# Altium footprint library 20210518.PcbLib: 414 footprints (part 24 of 26)
Each footprint in its own frame and in the unit in brackets; x right, y up, seen from the top. Pads: shape width x height; smd on the part's side, far side on the other; paste and mask are expansions set on the pad; w line width, h text height; cw(c..) or ccw(c..) is an arc to the next point about the centre after c.
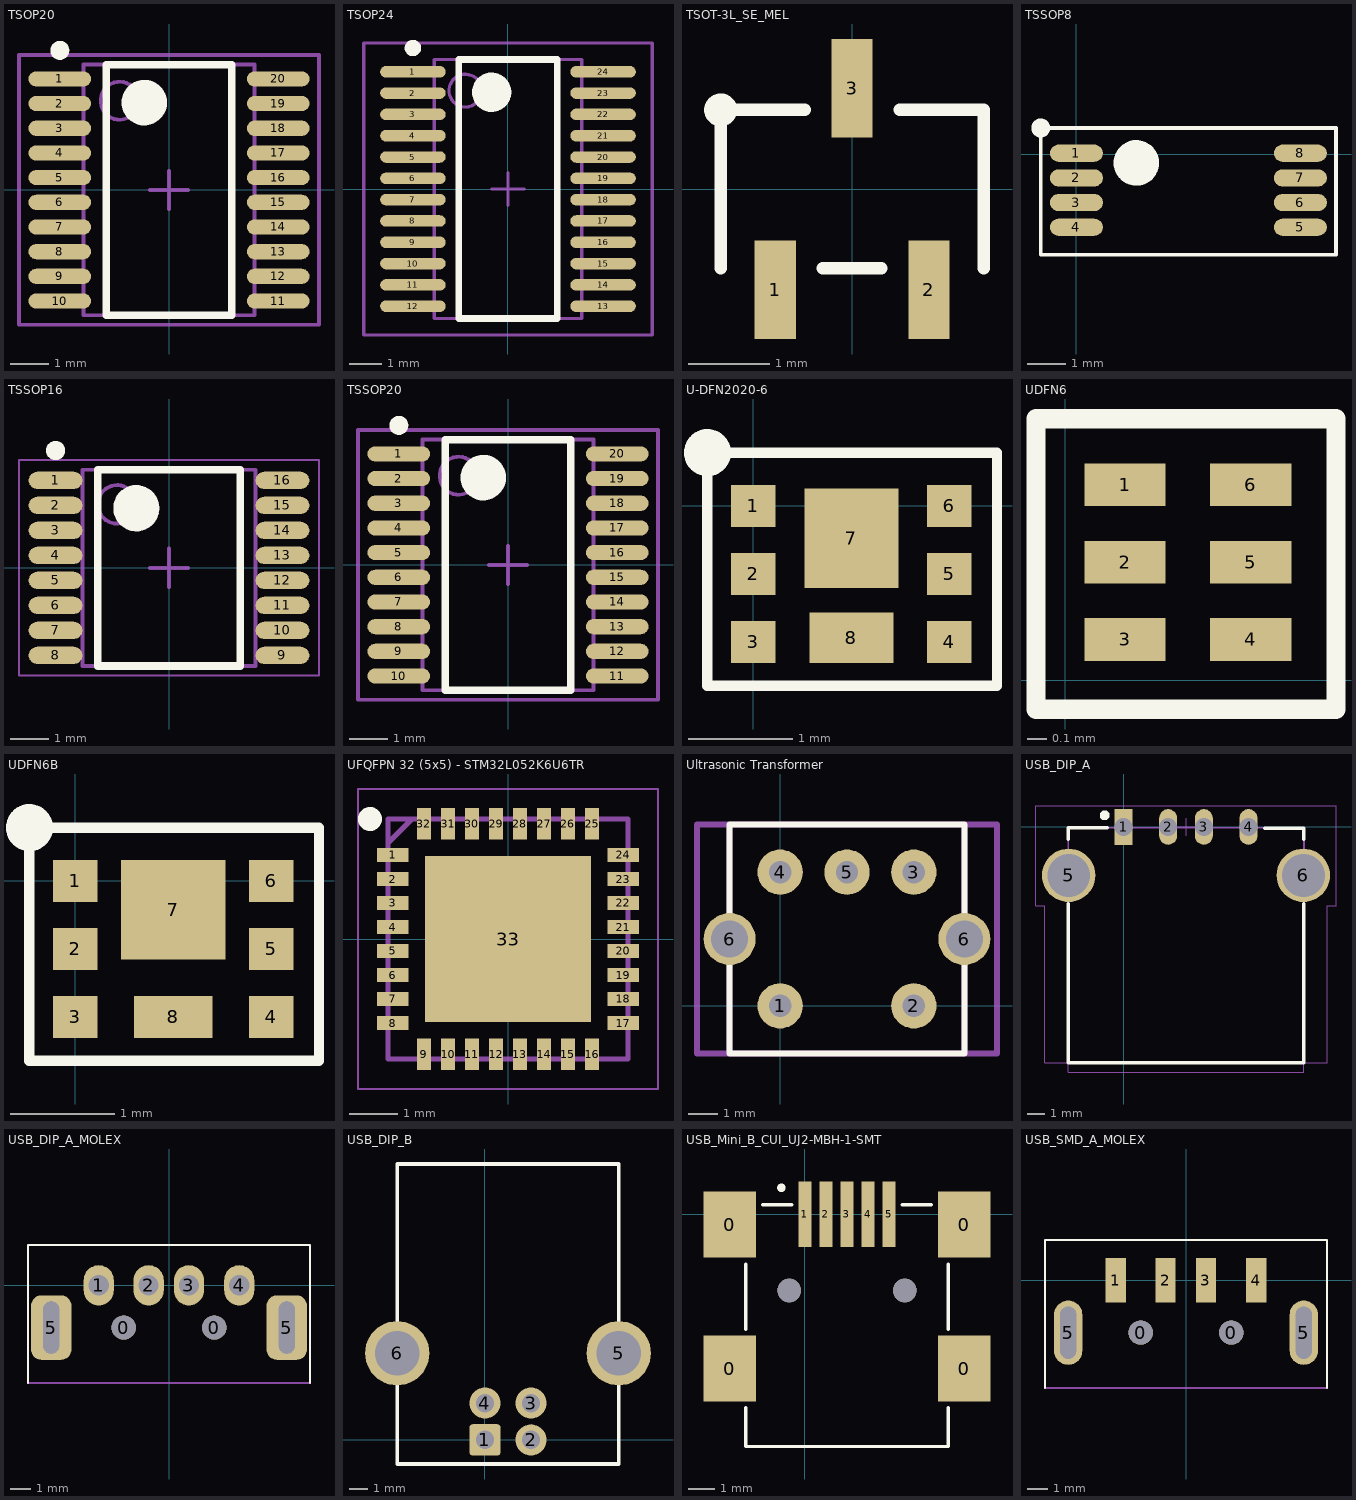
[diagram p23: the footprints below, top view; thin cyan lines are the x and y axes]

## TSOP20 [mm] "TSOP, 20-Leads, Body 6,6x4,5mm (max), Pitch 0,65mm, IPC Medium Density"
height 1.45
pads (20):
  oval 1.65x0.4 smd: 1(-2.875,2.925) 2(-2.875,2.275) 3(-2.875,1.625) 4(-2.875,0.975) 5(-2.875,0.325) 6(-2.875,-0.325) 7(-2.875,-0.975) 8(-2.875,-1.625) 9(-2.875,-2.275) 10(-2.875,-2.925) 11(2.875,-2.925) 12(2.875,-2.275) 13(2.875,-1.625) 14(2.875,-0.975) 15(2.875,-0.325) 16(2.875,0.325) 17(2.875,0.975) 18(2.875,1.625) 19(2.875,2.275) 20(2.875,2.925)
Top Overlay:
  circle w0.6: c-0.65,2.3 r0.3
  circle w0.25: c-2.875,3.675 r0.125
  lines w0.2: -1.65,-3.3 1.65,-3.3 1.65,3.3 -1.65,3.3 -1.65,-3.3
Mechanical 13:
  circle w0.1: c-1.3,2.35 r0.5
  lines w0.1: -2.25,-3.3 2.25,-3.3 2.25,3.3 -2.25,3.3 -2.25,-3.3
Mechanical 15:
  lines w0.1: -0.5,0 0.5,0 ; 0,-0.5 0,0.5 ; -3.95,-3.55 3.95,-3.55 3.95,3.55 -3.95,3.55 -3.95,-3.55
3D body: height 1.79, standoff -0.05, extent -3.3,-3.3 3.3,3.3

## TSOP24 [mm] "TSOP, 24-Leads, Body 7,9x4,5mm (max), Pitch 0,65mm, IPC Low Density"
height 1.2
pads (24):
  oval 2x0.35 smd: 1(-2.9,3.575) 2(-2.9,2.925) 3(-2.9,2.275) 4(-2.9,1.625) 5(-2.9,0.975) 6(-2.9,0.325) 7(-2.9,-0.325) 8(-2.9,-0.975) 9(-2.9,-1.625) 10(-2.9,-2.275) 11(-2.9,-2.925) 12(-2.9,-3.575) 13(2.9,-3.575) 14(2.9,-2.925) 15(2.9,-2.275) 16(2.9,-1.625) 17(2.9,-0.975) 18(2.9,-0.325) 19(2.9,0.325) 20(2.9,0.975) 21(2.9,1.625) 22(2.9,2.275) 23(2.9,2.925) 24(2.9,3.575)
Top Overlay:
  circle w0.6: c-0.5,2.95 r0.3
  circle w0.25: c-2.9,4.3 r0.125
  lines w0.2: -1.5,-3.95 1.5,-3.95 1.5,3.95 -1.5,3.95 -1.5,-3.95
Mechanical 13:
  circle w0.1: c-1.3,3 r0.5
  lines w0.1: -2.25,-3.95 2.25,-3.95 2.25,3.95 -2.25,3.95 -2.25,-3.95
Mechanical 15:
  lines w0.1: -0.5,0 0.5,0 ; 0,-0.5 0,0.5 ; -4.4,-4.45 4.4,-4.45 4.4,4.45 -4.4,4.45 -4.4,-4.45
3D body: height 1.2, standoff 0, extent -3.251,-3.963 3.299,3.937

## TSOT-3L_SE_MEL [mil]
pads (3):
  rect 20x48 smd: 1(-37.4,-49) 2(37.4,-49) 3(0,49)
Top Overlay:
  circle w6: c-64,38.5 r5
  lines w6: -64,-38.5 -64,38.5 -23.1,38.5 ; -14.3,-38.5 14.3,-38.5 ; 23.1,38.5 64,38.5 64,-38.5
3D body: height 39.09, standoff 0, extent -59.02,-58.01 59.01,60.02

## TSSOP8 [mm]
pads (8):
  oval 1.4x0.45 smd: 1(0,0.025) 2(0,-0.625) 3(0,-1.275) 4(0,-1.925) 5(5.9,-1.925) 6(5.9,-1.275) 7(5.9,-0.625) 8(5.9,0.025)
Top Overlay:
  circle w0.25: c-0.94,0.69 r0.125
  circle w0.6: c1.58,-0.23 r0.3
  lines w0.1: -0.94,-2.65 6.84,-2.65 6.84,0.69 -0.94,0.69 -0.94,-2.65
3D body: height 1.08, standoff -0.02, extent -0.202,-2.464 6.198,0.536

## TSSOP16 [mm] "TSSOP, 16-Leads, Body 5,00x4,40mm, Pitch 0,65mm, IPC Medium Density"
height 1.2
pads (16):
  oval 1.4x0.45 smd: 1(-2.95,2.275) 2(-2.95,1.625) 3(-2.95,0.975) 4(-2.95,0.325) 5(-2.95,-0.325) 6(-2.95,-0.975) 7(-2.95,-1.625) 8(-2.95,-2.275) 9(2.95,-2.275) 10(2.95,-1.625) 11(2.95,-0.975) 12(2.95,-0.325) 13(2.95,0.325) 14(2.95,0.975) 15(2.95,1.625) 16(2.95,2.275)
Top Overlay:
  circle w0.6: c-0.85,1.55 r0.3
  circle w0.25: c-2.95,3.05 r0.125
  lines w0.2: -1.85,-2.55 1.85,-2.55 1.85,2.55 -1.85,2.55 -1.85,-2.55
Mechanical 13:
  circle w0.1: c-1.35,1.65 r0.5
  lines w0.1: -2.25,-2.55 2.25,-2.55 2.25,2.55 -2.25,2.55 -2.25,-2.55
Mechanical 15:
  lines w0.05: -3.9,-2.8 3.9,-2.8 3.9,2.8 -3.9,2.8 -3.9,-2.8
  lines w0.1: -0.5,0 0.5,0 ; 0,-0.5 0,0.5
3D body: height 1.09, standoff 0, extent -3.166,-2.514 3.114,2.486

## TSSOP20 [mm]
height 1.45
pads (20):
  oval 1.65x0.4 smd: 1(-2.875,2.925) 2(-2.875,2.275) 3(-2.875,1.625) 4(-2.875,0.975) 5(-2.875,0.325) 6(-2.875,-0.325) 7(-2.875,-0.975) 8(-2.875,-1.625) 9(-2.875,-2.275) 10(-2.875,-2.925) 11(2.875,-2.925) 12(2.875,-2.275) 13(2.875,-1.625) 14(2.875,-0.975) 15(2.875,-0.325) 16(2.875,0.325) 17(2.875,0.975) 18(2.875,1.625) 19(2.875,2.275) 20(2.875,2.925)
Top Overlay:
  circle w0.6: c-0.65,2.3 r0.3
  circle w0.25: c-2.875,3.675 r0.125
  lines w0.2: -1.65,-3.3 1.65,-3.3 1.65,3.3 -1.65,3.3 -1.65,-3.3
Mechanical 13:
  circle w0.1: c-1.3,2.35 r0.5
  lines w0.1: -2.25,-3.3 2.25,-3.3 2.25,3.3 -2.25,3.3 -2.25,-3.3
Mechanical 15:
  lines w0.1: -0.5,0 0.5,0 ; 0,-0.5 0,0.5 ; -3.95,-3.55 3.95,-3.55 3.95,3.55 -3.95,3.55 -3.95,-3.55
3D body: height 1.2, standoff 0, extent -3.3,-3.3 3.3,3.3

## U-DFN2020-6 [mm]
height 0.75
pads (8):
  rect 0.425x0.4 smd: 1(0,0) 2(0,-0.65) 3(0,-1.3) 4(1.875,-1.3) 5(1.875,-0.65) 6(1.875,0)
  rect 0.9x0.95 smd: 7(0.937,-0.31)
  rect 0.8x0.48 smd: 8(0.937,-1.26)
Top Overlay:
  circle w0.25: c-0.44,0.51 r0.1
  lines w0.1: -0.44,-1.72 -0.44,0.51 2.33,0.51 2.33,-1.72 -0.44,-1.72
3D body: height 0.77, standoff 0, extent -0.06,-1.65 1.94,0.35

## UDFN6 [mm] ".50"
pads (6):
  rect 0.42x0.22 smd: 1(0.31,1.01) 2(0.31,0.61) 3(0.31,0.21) 4(0.96,0.21) 5(0.96,0.61) 6(0.96,1.01)
Top Overlay:
  lines w0.1: -0.15,-0.15 1.4,-0.15 1.4,1.35 -0.15,1.35 -0.15,-0.15
3D body: height 0.55, standoff 0.55, extent 0.23,1.01 0.33,1.11
3D body: height 0.55, standoff 0.01, extent 0.13,0.01 1.13,1.21

## UDFN6B [mm]
height 0.75
pads (8):
  rect 0.425x0.4 smd: 1(0,0) 2(0,-0.65) 3(0,-1.3) 4(1.875,-1.3) 5(1.875,-0.65) 6(1.875,0)
  rect 1x0.95 smd: 7(0.937,-0.275)
  rect 0.75x0.4 smd: 8(0.937,-1.3)
Top Overlay:
  circle w0.25: c-0.44,0.51 r0.1
  lines w0.1: -0.44,-1.72 2.33,-1.72 2.33,0.51 -0.44,0.51 -0.44,-1.72
3D body: height 0.77, standoff 0, extent -0.06,-1.65 1.94,0.35

## UFQFPN 32 (5x5) - STM32L052K6U6TR [mm]
height 0.55
pads (33):
  rect 0.65x0.3 smd: 1(-2.4,1.75) 2(-2.4,1.25) 3(-2.4,0.75) 4(-2.4,0.25) 5(-2.4,-0.25) 6(-2.4,-0.75) 7(-2.4,-1.25) 8(-2.4,-1.75) 17(2.4,-1.75) 18(2.4,-1.25) 19(2.4,-0.75) 20(2.4,-0.25) 21(2.4,0.25) 22(2.4,0.75) 23(2.4,1.25) 24(2.4,1.75)
  rect 0.3x0.65 smd: 9(-1.75,-2.4) 10(-1.25,-2.4) 11(-0.75,-2.4) 12(-0.25,-2.4) 13(0.25,-2.4) 14(0.75,-2.4) 15(1.25,-2.4) 16(1.75,-2.4) 25(1.75,2.4) 26(1.25,2.4) 27(0.75,2.4) 28(0.25,2.4) 29(-0.25,2.4) 30(-0.75,2.4) 31(-1.25,2.4) 32(-1.75,2.4)
  rect 3.45x3.45 smd: 33(0,0)
Top Overlay:
  circle w0.25: c-2.875,2.5 r0.125
Mechanical 8:
  lines w0.05: -3.125,-3.125 -3.125,3.125 3.125,3.125 3.125,-3.125 -3.125,-3.125
  lines w0.1: -2.5,2 -2,2.5 ; -2.5,-2.5 -2.5,2.5 2.5,2.5 2.5,-2.5 -2.5,-2.5
3D body: height 0.6, standoff 0, extent -2.55,-2.55 2.55,2.55

## Ultrasonic Transformer [mm] "Prowave Ultrasonic Transformer"
pads (7):
  round 1.524 hole 0.75: 1(0,0) 2(4.5,0) 3(4.5,4.5) 4(0,4.5) 5(2.25,4.5)
  oval 1.75x1.753 hole 1.25: 6(-1.7,2.25)
  round 1.75 hole 1.25: 6(6.2,2.25)
Top Overlay:
  lines w0.2: -1.7,-1.6 6.2,-1.6 6.2,6.1 -1.7,6.1 -1.7,-1.6
Mechanical 13:
  lines w0.2: -1.7,-1.6 -1.7,6.1 6.2,6.1 6.2,-1.6 -1.7,-1.6
Mechanical 15:
  lines w0.2: -2.8,-1.6 7.3,-1.6 7.3,6.1 -2.8,6.1 -2.8,-1.6

## USB_DIP_A [mm] "USB Type A Connector"
pads (6):
  rect 1x2 hole 1: 1(0,0)
  oval 1x2 hole 1: 2(2.5,0) 3(4.5,0) 4(7,0)
  round 3 hole 2.4: 5(-3.07,-2.71) 6(10.07,-2.71)
Top Overlay:
  circle w0.3: c-1.05,0.65 r0.125
  lines w0.2: -3.1,-4.3 -3.1,-13.2 10.1,-13.2 10.1,-4.3 ; -3.1,-0.7 -3.1,-0.05 -0.9,-0.05 ; 7.9,-0.07 10.1,-0.07 10.1,-0.7
Mechanical 12:
  lines w0.001: -3.1,-13.75 -3.1,-0.05 10.1,-0.05 10.1,-13.75 -3.1,-13.75
Mechanical 13:
  lines w0.1: -3.1,-13.2 -3.1,-0.05 10.1,-0.05 10.1,-13.2 -3.1,-13.2
Mechanical 15:
  lines w0.05: 3,0 4,0 ; 3.5,-0.5 3.5,0.5 ; -4.9,-4.4 -4.9,1.2 11.9,1.2 11.9,-4.4 11.4,-4.4 11.4,-13.2 -4.4,-13.2 -4.4,-4.4 -4.9,-4.4
3D body: height 7.45, standoff -3.4, extent -4.4,-13.18 11.4,0.98

## USB_DIP_A_MOLEX [mm] "480370001"
pads (8):
  round 1.2 hole 1.2: 0(-2.25,-2.1) 0(2.25,-2.1)
  oval 1.5x2 hole 1: 1(-3.49,0) 2(-1.01,0) 3(0.99,0) 4(3.49,0)
  rrect50% 2x3.2 hole 0.8 slot 2.6 at 90 deg: 5(-5.85,-2.1) 5(5.85,-2.1)
Top Overlay:
  lines w0.1: -7,-4.85 -7,-2.6 -7,2 7,2 7,-2.6 7,-4.85
Mechanical 15:
  lines w0.1: -7,-4.85 7,-4.85
3D body: height 3.05, standoff -2.92, extent -6.348,-19.9 6.348,0.125

## USB_DIP_B [mm] "USB B type shielded connector"
height 10.9
pads (6):
  rrect20% 1.7x1.7 hole 1: 1(0,0)
  round 1.7 hole 1: 2(2.5,0) 3(2.5,2) 4(0,2)
  round 3.5 hole 2.4: 5(7.27,4.71) 6(-4.77,4.71)
Top Overlay:
  lines w0.2: -4.775,-1.31 7.275,-1.31 ; -4.77,-1.31 -4.77,14.99 7.27,14.99 7.27,-1.31
3D body: height 10.7, standoff -3.95, extent -6.3,-1.425 8.6,15.075

## USB_Mini_B_CUI_UJ2-MBH-1-SMT [mm]
pads (11):
  rect 2x2.5 smd: 0(-2.86,-5.87) 0(-2.86,-0.39) 0(6.06,-5.87) 0(6.06,-0.39)
  rect 0.5x2.5 smd: 1(0,0) 2(0.8,0) 3(1.6,0) 4(2.4,0) 5(3.2,0)
  round 0.9 hole 0.9 unplated: ""(-0.6,-2.9) ""(3.8,-2.9)
Top Overlay:
  circle w0.16: c-0.9,1.01 r0.08
  lines w0.127: -2.26,-7.37 -2.26,-8.84 5.46,-8.84 5.46,-7.37 ; -2.26,-4.37 -2.26,-1.89 ; -1.61,0.36 -0.5,0.36 ; 3.7,0.36 4.81,0.36 ; 5.46,-4.37 5.46,-1.89
Mechanical 13:
  circle w0.16: c0,0.15 r0.08
3D body: height 3.9, standoff -1, extent -3.22,-8.85 6.44,0.55

## USB_SMD_A_MOLEX [mm] "480372200"
pads (8):
  round 1.2 hole 1.2: 0(-2.25,-2.6) 0(2.25,-2.6)
  rect 1x2.2 smd: 1(-3.49,0) 2(-1.01,0) 3(0.99,0) 4(3.49,0)
  oval 1.4x3.2 hole 0.8 slot 2.6 at 90 deg: 5(-5.85,-2.6) 5(5.85,-2.6)
Top Overlay:
  lines w0.1: -7,-5.35 -7,-2.6 -7,2 7,2 7,-2.6 7,-5.35
Mechanical 15:
  lines w0.1: -7,-5.35 7,-5.35
3D body: height 2.25, standoff -2.25, extent -6.015,-20.35 6.035,0.6